# Altium footprint library Cty1.PcbLib: 1378 footprints (part 20 of 87)
Each footprint in its own frame and in the unit in brackets; x right, y up, seen from the top. Pads: shape width x height; smd on the part's side, far side on the other; paste and mask are expansions set on the pad; w line width, h text height; cw(c..) or ccw(c..) is an arc to the next point about the centre after c.
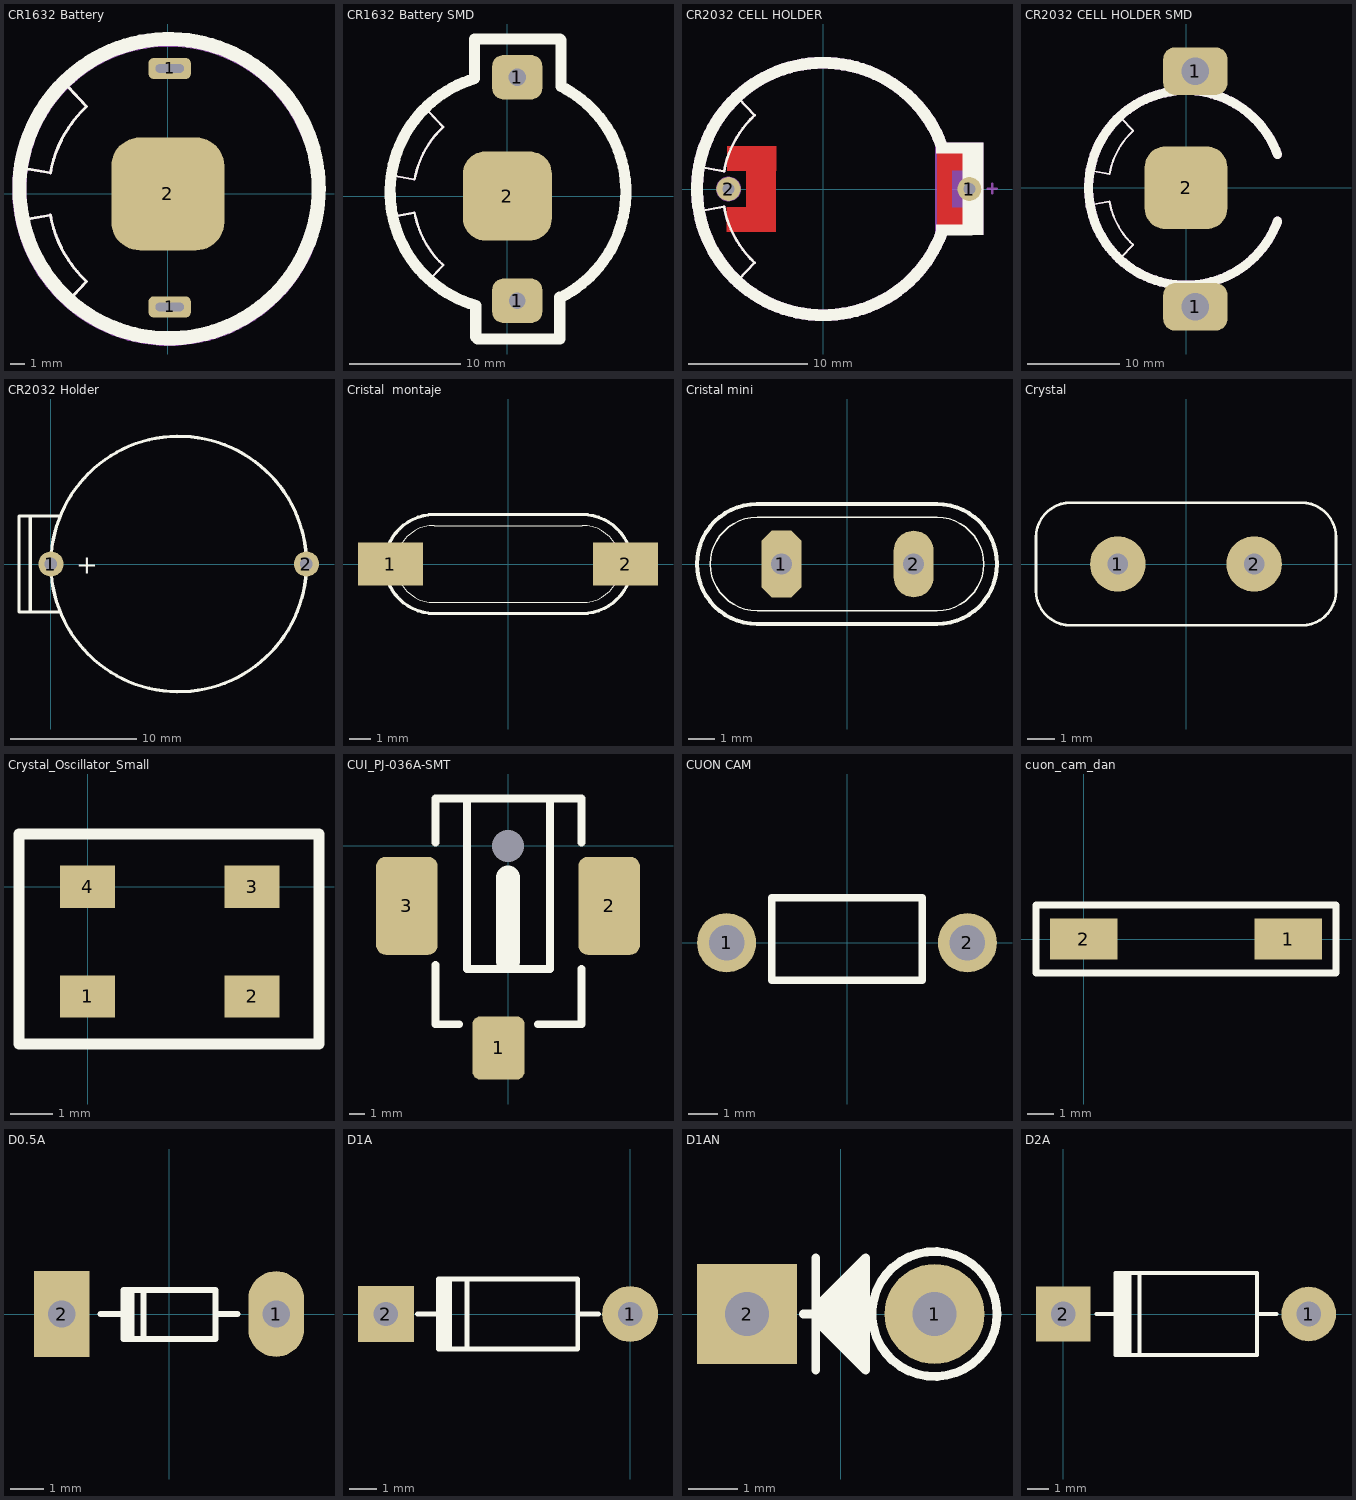
[diagram p19: the footprints below, top view; thin cyan lines are the x and y axes]

## CR1632 Battery [mm]
pads (3):
  rrect50% 3x1.5 hole 0.6 slot 2 at 0 deg: 1(0.127,-8.001) 1(0.127,8.89)
  rrect50% 8x8 smd: 2(0,0)
Top Overlay:
  lines w0.2: -10.325,-1.85 -8.35,-1.5 ; -10.325,1.85 -8.35,1.5 ; -8.325,-1.496 ccw(c0,0) -5.759,-6.195 -7.1,-7.625 ; -8.325,1.496 cw(c0,0) -5.759,6.195 -7.1,7.625
  lines w1: 10.668,-0.133 cw(c0.08,0.377) 10.668,-0.127
Mechanical 7:
  lines w0.2: -10.325,-1.85 -8.35,-1.5 ; -10.325,1.85 -8.35,1.5 ; -8.325,-1.496 ccw(c0,0) -5.759,-6.195 -7.1,-7.625 ; -8.325,1.496 cw(c0,0) -5.759,6.195 -7.1,7.625
  lines w1: 10.022,3.989 ccw(c0.074,0.328) 10.033,-3.302
3D body "keystone 3012-30.step": height 5, standoff -1.73, extent -7.417,-8.509 7.925,9.434
3D body "cr-1632 batt.step": height -0.41, standoff -3.61, extent -8,-7.619 8,8.381

## CR1632 Battery SMD [mm]
pads (3):
  rrect50% 4.5x4 hole 1.5: 1(0.889,-9.398)
  rrect50% 4.5x4 hole 1.6: 1(0.889,10.668)
  rrect50% 8x8 smd: 2(0,0)
Top Overlay:
  lines w0.2: -10.325,-1.85 -8.35,-1.5 ; -10.325,1.85 -8.35,1.5 ; -8.325,-1.496 ccw(c0,0) -5.759,-6.195 -7.1,-7.625 ; -8.325,1.496 cw(c0,0) -5.759,6.195 -7.1,7.625
  lines w0.254: -2.935,14.083 -2.921,14.097 ; -2.84,-12.654 -2.667,-12.827 ; 4.699,14.097 4.799,13.997
  lines w1: -2.935,14.083 -2.935,10.54 ccw(c0.08,0.377) -2.84,-9.813 -2.84,-12.654 ; -2.921,14.097 4.699,14.097 ; -2.667,-12.827 4.699,-12.827 4.699,-9.086 ; 4.797,-9.086 ccw(c0.033,0.383) 4.799,9.851 4.799,13.997
Mechanical 7:
  lines w0.2: -10.325,-1.85 -8.35,-1.5 ; -10.325,1.85 -8.35,1.5 ; -8.325,-1.496 ccw(c0,0) -5.759,-6.195 -7.1,-7.625 ; -8.325,1.496 cw(c0,0) -5.759,6.195 -7.1,7.625
3D body "cr-1632 batt.step": height -0.41, standoff -3.61, extent -7.874,-7.492 8.126,8.508
3D body "keystone 3012-301.step": height 3.97, standoff 0.01, extent -6.579,-10.973 8.763,12.243

## CR2032 CELL HOLDER [mm]
pads (2):
  round 2 hole 1: 1(12.275,0) 2(-7.95,0)
Top Layer:
  rectangle: -6.475,-3.6 -3.95,3.6
  region: -3.941,1.527 -3.941,3.602 -8.09,3.602 -8.09,1.527
  region: -8.109,-1.527 -8.109,-3.602 -3.959,-3.602 -3.959,-1.527
  region: 12.298,1.534 12.298,3.609 9.573,3.609 9.573,1.534
  region: 9.577,-1.534 9.577,-3.609 12.302,-3.609 12.302,-1.534
  region: 10.802,3.591 9.577,3.591 9.577,-3.609 10.802,-3.609
Top Overlay:
  rectangle: 11.716,-3.877 13.466,3.898
  region: 9.466,3.873 9.466,2.998 12.591,2.998 12.591,3.873
  region: 12.59,-3.877 12.59,-3.002 9.466,-3.002 9.466,-3.877
  lines w0.2: -10.325,-1.85 -8.35,-1.5 ; -10.325,1.85 -8.35,1.5 ; -8.325,-1.496 ccw(c0,0) -5.759,-6.195 -7.1,-7.625 ; -8.325,1.496 cw(c0,0) -5.759,6.195 -7.1,7.625 ; 10.4,-3.8 12.5,-3.8 ; 10.425,3.8 12.5,3.8
  lines w1: 9.948,3.661 ccw(c0,0) 9.959,-3.63
Mechanical 7:
  circle w0.4: c-7.95,0 r0.848
  rectangle: 9.398,-3.875 13.475,3.9
  lines w0.2: -10.325,-1.85 -8.35,-1.5 ; -10.325,1.85 -8.35,1.5 ; -8.325,-1.496 ccw(c0,0) -5.759,-6.195 -7.1,-7.625 ; -8.325,1.496 cw(c0,0) -5.759,6.195 -7.1,7.625 ; 13.796,0.026 14.396,0.026 14.596,0.026 ; 14.196,-0.374 14.196,0.426
  lines w1: 9.948,3.661 ccw(c0,0) 9.959,-3.63
3D body: height 0.8, standoff 0.1, extent -8.429,-1.202 -0.041,0.999
3D body: height 0.2, standoff -2.3, extent -8.357,-0.418 -7.518,0.395
3D body: height 0.2, standoff -2.3, extent 11.887,-0.381 12.624,0.381
3D body: height 0.18, standoff 0, extent 10.984,-0.459 12.876,0.49
3D body: height 0.5, standoff 0, extent -10.565,-0.628 10.654,10.59
3D body: height 9, standoff 1, extent 9.725,-3.062 11.187,3.239
3D body: height 10, standoff 0, extent 12.652,-3.687 13.171,3.441
3D body: height 9.9, standoff 0, extent 9.646,-3.974 13.165,3.915
3D body: height 6, standoff 0, extent -10.617,-10.589 10.582,10.629
3D body: height 0.5, standoff 0, extent -10.561,-10.522 10.658,0.696
3D body "CR 2032 Lithium Cell.step": height 5, standoff 1.8, extent -9.873,-10.127 10.127,9.873

## CR2032 CELL HOLDER SMD [mm]
pads (3):
  rrect50% 7x5.2 hole 3: 1(1.016,-12.954) 1(1.016,12.7)
  rrect50% 9x9 smd: 2(0,0)
Top Overlay:
  lines w0.2: -10.325,-1.85 -8.35,-1.5 ; -10.325,1.85 -8.35,1.5 ; -8.325,-1.496 ccw(c0,0) -5.759,-6.195 -7.1,-7.625 ; -8.325,1.496 cw(c0,0) -5.759,6.195 -7.1,7.625
  lines w1: 9.948,3.661 ccw(c0,0) 9.959,-3.63
Mechanical 7:
  lines w0.2: -10.325,-1.85 -8.35,-1.5 ; -10.325,1.85 -8.35,1.5 ; -8.325,-1.496 ccw(c0,0) -5.759,-6.195 -7.1,-7.625 ; -8.325,1.496 cw(c0,0) -5.759,6.195 -7.1,7.625
  lines w1: 9.948,3.661 ccw(c0,0) 9.959,-3.63
3D body "CR 2032 Lithium Cell.step": height 3.2, standoff 0, extent -9.873,-10.127 10.127,9.873
3D body "3002.step": height 3.97, standoff 0.01, extent -8.757,-15.494 11.297,15.24

## CR2032 Holder [mm]
pads (2):
  round 2 hole 1: 1(0,0) 2(20.32,0)
Top Overlay:
  circle w0.254: c10.16,0 r10.161
  lines w0.254: -1.651,-3.81 -1.651,3.81 ; 0.635,-3.81 -2.54,-3.81 -2.54,3.81 0.635,3.81
  text "+" at 2.032,-0.762 h1.52

## Cristal  montaje [mm] "Cristal de cuarzo de montaje superficial"
pads (2):
  rect 3x2 smd: 1(-5.45,0) 2(5.425,0)
Top Overlay:
  lines w0.051: -3.429,-1.778 cw(c-3.429,0) -3.429,1.778 3.429,1.778 cw(c3.429,0) 3.429,-1.778 -3.429,-1.778
  lines w0.152: -3.429,-2.286 cw(c-3.429,0) -3.429,2.286 3.429,2.286 cw(c3.429,0) 3.429,-2.286 -3.429,-2.286
3D body "CRISTAL DE MONTAJEhcm49.STEP": height 4.24, standoff 0, extent -6.075,-2.375 6.325,2.455

## Cristal mini [mm] "Cristal de cuarzo empaque pequeño"
pads (2):
  oct 1.524x2.54 hole 0.8: 1(-2.5,0)
  oval 1.524x2.54 hole 0.8: 2(2.54,0)
Top Overlay:
  lines w0.051: -3.429,-1.778 cw(c-3.429,0) -3.429,1.778 3.429,1.778 cw(c3.429,0) 3.429,-1.778 -3.429,-1.778
  lines w0.152: -3.429,-2.286 cw(c-3.429,0) -3.429,2.286 3.429,2.286 cw(c3.429,0) 3.429,-2.286 -3.429,-2.286
3D body "SW3dPS-HP49US.STEP": height 3.5, standoff -4, extent -5.625,-2.35 5.725,2.3

## Crystal [mil]
pads (2):
  round 80 hole 30: 1(-98.43,0) 2(98.43,0)
Top Overlay:
  lines w3.94: -216.54,-38.58 ccw(c-166.54,-38.58) -166.54,-88.58 167.32,-88.58 ccw(c167.32,-39.37) 216.54,-39.37 216.54,38.58 ccw(c166.54,38.58) 166.54,88.58 -147.64,88.58 -166.54,88.58 ccw(c-166.54,38.58) -216.54,38.58 -216.54,-29.53 -216.54,-38.58
3D body "User Library-HC49U-2.step": height 519.68, standoff -78.74, extent -216.54,-88.58 216.54,88.58

## Crystal_Oscillator_Small [mm]
pads (4):
  rect 1.3x1 smd: 1(0,-2.6) 2(3.9,-2.6) 3(3.9,0) 4(0,0)
Top Overlay:
  lines w0.254: -1.623,-3.73 5.484,-3.73 5.484,1.25 -1.623,1.25 -1.623,-3.73

## CUI_PJ-036A-SMT [mm]
pads (4):
  rrect30% 3.3x4 smd: 1(-0.6,-12.8)
  rrect30% 3.9x6.2 smd: 2(6.4,-3.8) 3(-6.4,-3.8)
  rrect30% 0x0 hole 2.032 unplated: 4(0,0)
Top Overlay:
  lines w0.5: -4.6,-7.55 -4.6,-11.3 -3.1,-11.3 ; -4.6,0.2 -4.6,3 4.65,3 4.65,0.2 ; -2.6,3 -2.6,-7.8 2.65,-7.8 2.65,2.9 ; 1.9,-11.3 4.65,-11.3 4.65,-7.8
  lines w1.5: 0,-7.3 0,-2
3D body "CUI-PJ-036A-SMT.step": height 11.09, standoff -1.51, extent -7.5,-14.1 7.7,3

## CUON CAM [mm] "Dang cam giong tro"
pads (2):
  round 2 hole 1.2: 1(-4.064,0) 2(4.064,0)
Top Overlay:
  lines w0.254: -2.54,-1.27 2.54,-1.27 2.54,1.524 -2.54,1.524 -2.54,-1.27

## cuon_cam_dan [mm] "cuon cam dan"
pads (2):
  rect 2.5x1.524 smd: 1(7.62,0) 2(0,0)
Top Overlay:
  lines w0.254: -1.778,-1.27 -1.778,1.27 9.398,1.27 9.398,-1.27 -1.778,-1.27

## D0.5A [mil] "Diode muoi, W 80mil, L 300mil"
height 80
pads (2):
  oval 65x100 hole 32: 1(125,0)
  rect 65x100 hole 32: 2(-125,0)
Top Overlay:
  rectangle: -55,-30 -40,25
  lines w7: -80,0 -53,0 ; -30,-29 -30,28 ; 54,0 80,0 ; -53,-29 54,-29 54,28 -53,28 -53,-29
3D body "SW3dPS-1N4148.STEP": height 61.22, standoff -50, extent -108.5,-32.96 108.5,32

## D1A [mil] "Diode 1A, W 100mil, L 350mil"
height 100
pads (2):
  round 80 hole 35: 1(0,0)
  rect 80x80 hole 35: 2(-350,0)
Top Overlay:
  rectangle: -275,-50 -255,50
  lines w7: -305,0 -275,0 ; -275,-16 -275,0 ; -275,21 -275,0 ; -234,-50 -234,47 ; -75,0 -45,0 ; -275,0 -275,-50 -75,-50 -75,50 -275,50 -275,0
3D body "SW3dPS-do_35.STEP": height 84.5, standoff -100, extent -386.49,-33 34.49,36

## D1AN [mil] "Diode 1A, W 100mil, L 150mil"
height 100
pads (2):
  round 80 hole 35: 1(75,0)
  rect 80x80 hole 35: 2(-75,0)
Top Overlay:
  circle w7: c75,0 r50
  region: 20,40 20,-40 15,-40 -20,-5 -20,5
  lines w7: -30,0 -20,0 ; -20,-45 -20,45 ; -20,-5 20,-45 20,45 -20,5 -20,-5
3D body "SW3dPS-1N4007_Stand.STEP": height 252.32, standoff -78.14, extent -64,-50 104,55

## D2A [mil] "Diode 2A, W 150mil, L 450mil"
height 100
pads (2):
  round 100 hole 45: 1(450,0)
  rect 100x100 hole 45: 2(0,0)
Top Overlay:
  rectangle: 95,-75 125,75
  lines w7: 61,0 96,0 ; 96,-31 96,0 ; 96,32 96,0 ; 140,-75 140,75 ; 355,0 391,0 ; 96,-75 96,75 355,75 355,-75 96,-75
3D body "SW3DPS-DIODE0_4.step": height 100.5, standoff -100, extent 5,-47 435,54